# Altium footprint library RFID_RC632.PcbLib: 23 footprints (part 2 of 2)
Each footprint in its own frame and in the unit in brackets; x right, y up, seen from the top. Pads: shape width x height; smd on the part's side, far side on the other; paste and mask are expansions set on the pad; w line width, h text height; cw(c..) or ccw(c..) is an arc to the next point about the centre after c.
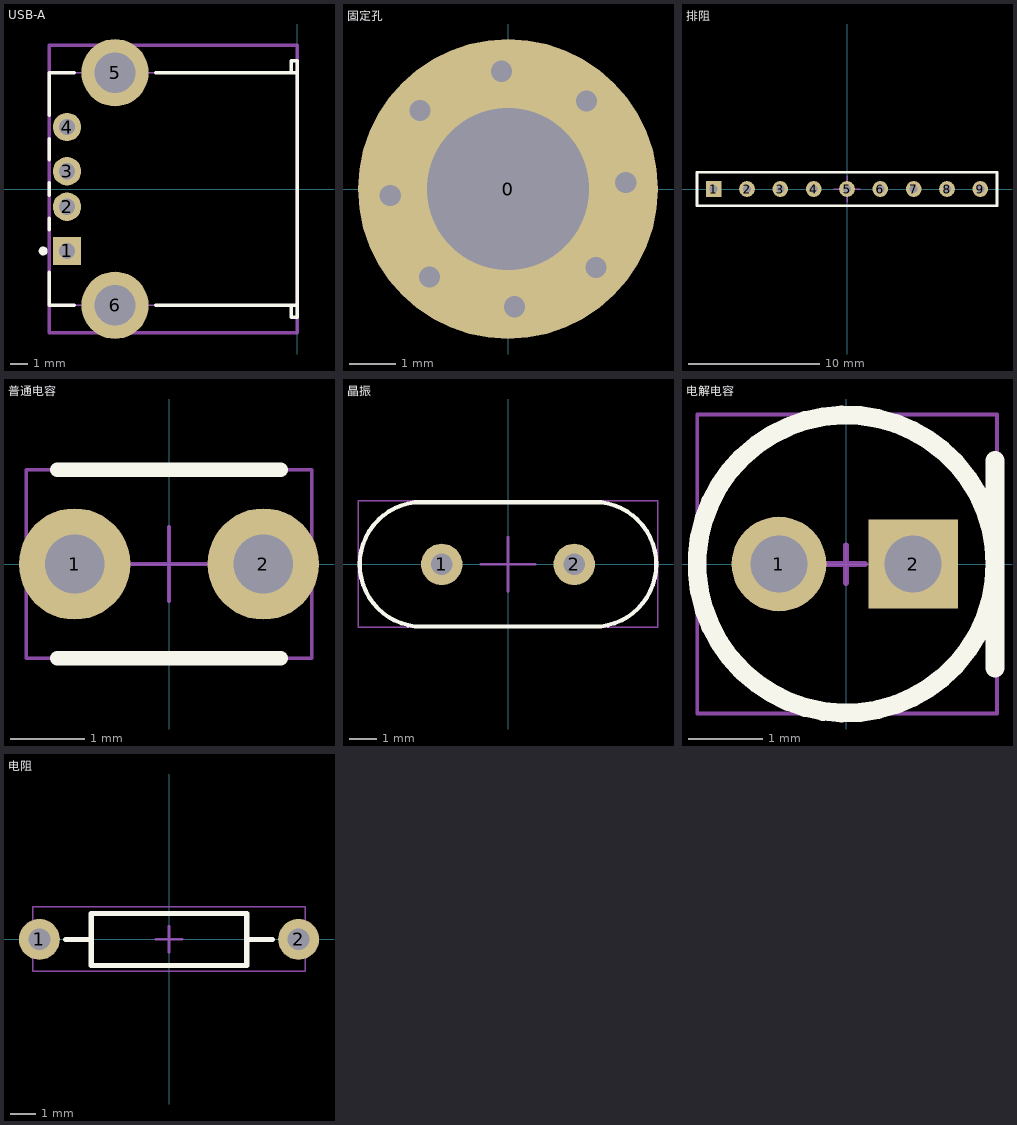
[diagram p1: the footprints below, top view; thin cyan lines are the x and y axes]

## USB-A [mm]
pads (6):
  rect 1.6x1.6 hole 0.92: 1(-12.99,-3.5)
  round 1.6 hole 0.92: 2(-12.99,-1) 3(-12.99,1) 4(-12.99,3.5)
  round 3.8 hole 2.3: 5(-10.28,6.57) 6(-10.28,-6.57)
Top Overlay:
  circle w0.25: c-14.34,-3.5 r0.125
  lines w0.2: -14,-4.7 -14,-6.565 -12.58,-6.565 ; -14,-2.3 -14,-1.66 ; -14,-0.34 -14,0.34 ; -14,1.66 -14,2.84 ; -14,4.16 -14,6.565 -12.58,6.565 ; -7.98,-6.565 0,-6.565 ; -7.98,6.565 0,6.565 ; -0.32,-6.565 -0.32,-7.25 0,-7.25 0,-6.565 ; -0.32,6.565 -0.32,7.25 0,7.25 0,6.565 ; 0,-6.565 0,6.565
Mechanical 13:
  lines w0.1: -14,-6.565 -14,6.565 -0.32,6.565 -0.32,7.25 0,7.25 0,-7.25 -0.32,-7.25 -0.32,-6.565 -14,-6.565
  lines w0.2: -14,-8.117 -14,8.117 0,8.117 0,-8.117 -14,-8.117
3D body "c-292303-3.stp": height 7.67, standoff -3.6, extent -14,-8.117 0,8.117

## 固定孔 [mm] "HOLE"
pads (1):
  round 6.5 hole 3.5: 0(0,0)
via -1.905,1.702 diameter 0.889 hole 0.457
via -2.55,-0.144 diameter 0.889 hole 0.457
via -1.702,-1.905 diameter 0.889 hole 0.457
via 0.144,-2.55 diameter 0.889 hole 0.457
via 1.905,-1.702 diameter 0.889 hole 0.457
via 2.55,0.144 diameter 0.889 hole 0.457
via 1.702,1.905 diameter 0.889 hole 0.457
via -0.144,2.55 diameter 0.889 hole 0.457

## 排阻 [mm]
pads (9):
  rect 1.2x1.2 hole 0.6 mask+0.102: 1(-10.16,0)
  round 1.2 hole 0.6 mask+0.102: 2(-7.62,0) 3(-5.08,0) 4(-2.54,0) 5(0,0) 6(2.54,0) 7(5.08,0) 8(7.62,0) 9(10.16,0)
Top Overlay:
  lines w0.2: -11.43,-1.27 -11.43,1.27 11.43,1.27 11.43,-1.27 -11.43,-1.27
Mechanical 13:
  lines w0.05: -11.43,-1.23 -11.43,1.27 11.43,1.27 11.43,-1.23 -11.43,-1.23
Mechanical 15:
  lines w0.1: -1,0 1,0 ; 0,-1 0,1
3D body "User Library-ResistorNetwork9SIP10KOhm.step": height 5.27, standoff -2.73, extent -11.16,-1 11.16,1

## 普通电容 [mm]
pads (2):
  round 1.5 hole 0.8: 1(-1.27,0) 2(1.27,0)
Top Overlay:
  lines w0.2: -1.5,-1.27 1.5,-1.27 ; -1.5,1.27 1.5,1.27
Mechanical 13:
  lines w0.05: -1.921,-1.27 -1.921,1.27 1.921,1.27 1.921,-1.27 -1.921,-1.27
Mechanical 15:
  lines w0.05: -0.5,0 0.5,0 ; 0,-0.5 0,0.5
3D body "rad5d-0.1.stp": height 5.43, standoff -3, extent -1.927,-1.27 1.926,1.27

## 晶振 [mil]
pads (2):
  round 60 hole 31.5: 1(-96.06,0) 2(96.06,0)
Top Overlay:
  lines w6: -135,-90 cw(c-124.43,0) -135,90 135,90 cw(c124.43,0) 135,-90 -135,-90
Mechanical 13:
  lines w1.97: -217.52,-91.07 217.52,-91.07 217.52,92 -217.52,92 -217.52,-91.07
Mechanical 15:
  lines w3.94: -39.37,0 39.37,0 ; 0,-39.37 0,39.37
3D body "hc-49s.stp": height 145.87, standoff -153.54, extent -217.52,-91.07 217.52,92

## 电解电容 [mm] "电解电容"
pads (2):
  round 1.27 hole 0.762: 1(-0.9,0)
  rect 1.2x1.2 hole 0.762: 2(0.9,0)
Top Overlay:
  circle w0.254: c0,0 r2
  lines w0.254: 2,-1.397 2,1.39
Mechanical 13:
  lines w0.05: -1.998,-2.007 -1.998,2.007 2.025,2.007 2.025,-2.007 -1.998,-2.007
Mechanical 15:
  lines w0.076: -0.254,0 0.254,0 ; 0,-0.254 0,0.254
3D body "cd110-4x7.stp": height 7.11, standoff -3.6, extent -1.998,-2.007 2.025,2.007

## 电阻 [mm]
pads (2):
  round 1.6 hole 0.85: 1(-5.08,0) 2(5.08,0)
Top Overlay:
  lines w0.2: -4.064,0 -3.048,0 ; 3.048,0 4.064,0 ; -3.048,-1.016 3.048,-1.016 3.048,1.016 -3.048,1.016 -3.048,-1.016
Mechanical 13:
  lines w0.05: -5.35,-1.245 -5.35,1.275 5.35,1.275 5.35,-1.245 -5.35,-1.245
Mechanical 15:
  lines w0.102: -0.508,0 0,0 ; 0,-0.508 0,0 ; 0,0.508 0,0 ; 0.508,0 0,0
3D body "axial25.stp": height 2.76, standoff -5.01, extent -5.35,-1.245 5.35,1.275